# Altium footprint library SoM_Artix.PcbLib: 239 footprints (part 12 of 15)
Each footprint in its own frame and in the unit in brackets; x right, y up, seen from the top. Pads: shape width x height; smd on the part's side, far side on the other; paste and mask are expansions set on the pad; w line width, h text height; cw(c..) or ccw(c..) is an arc to the next point about the centre after c.
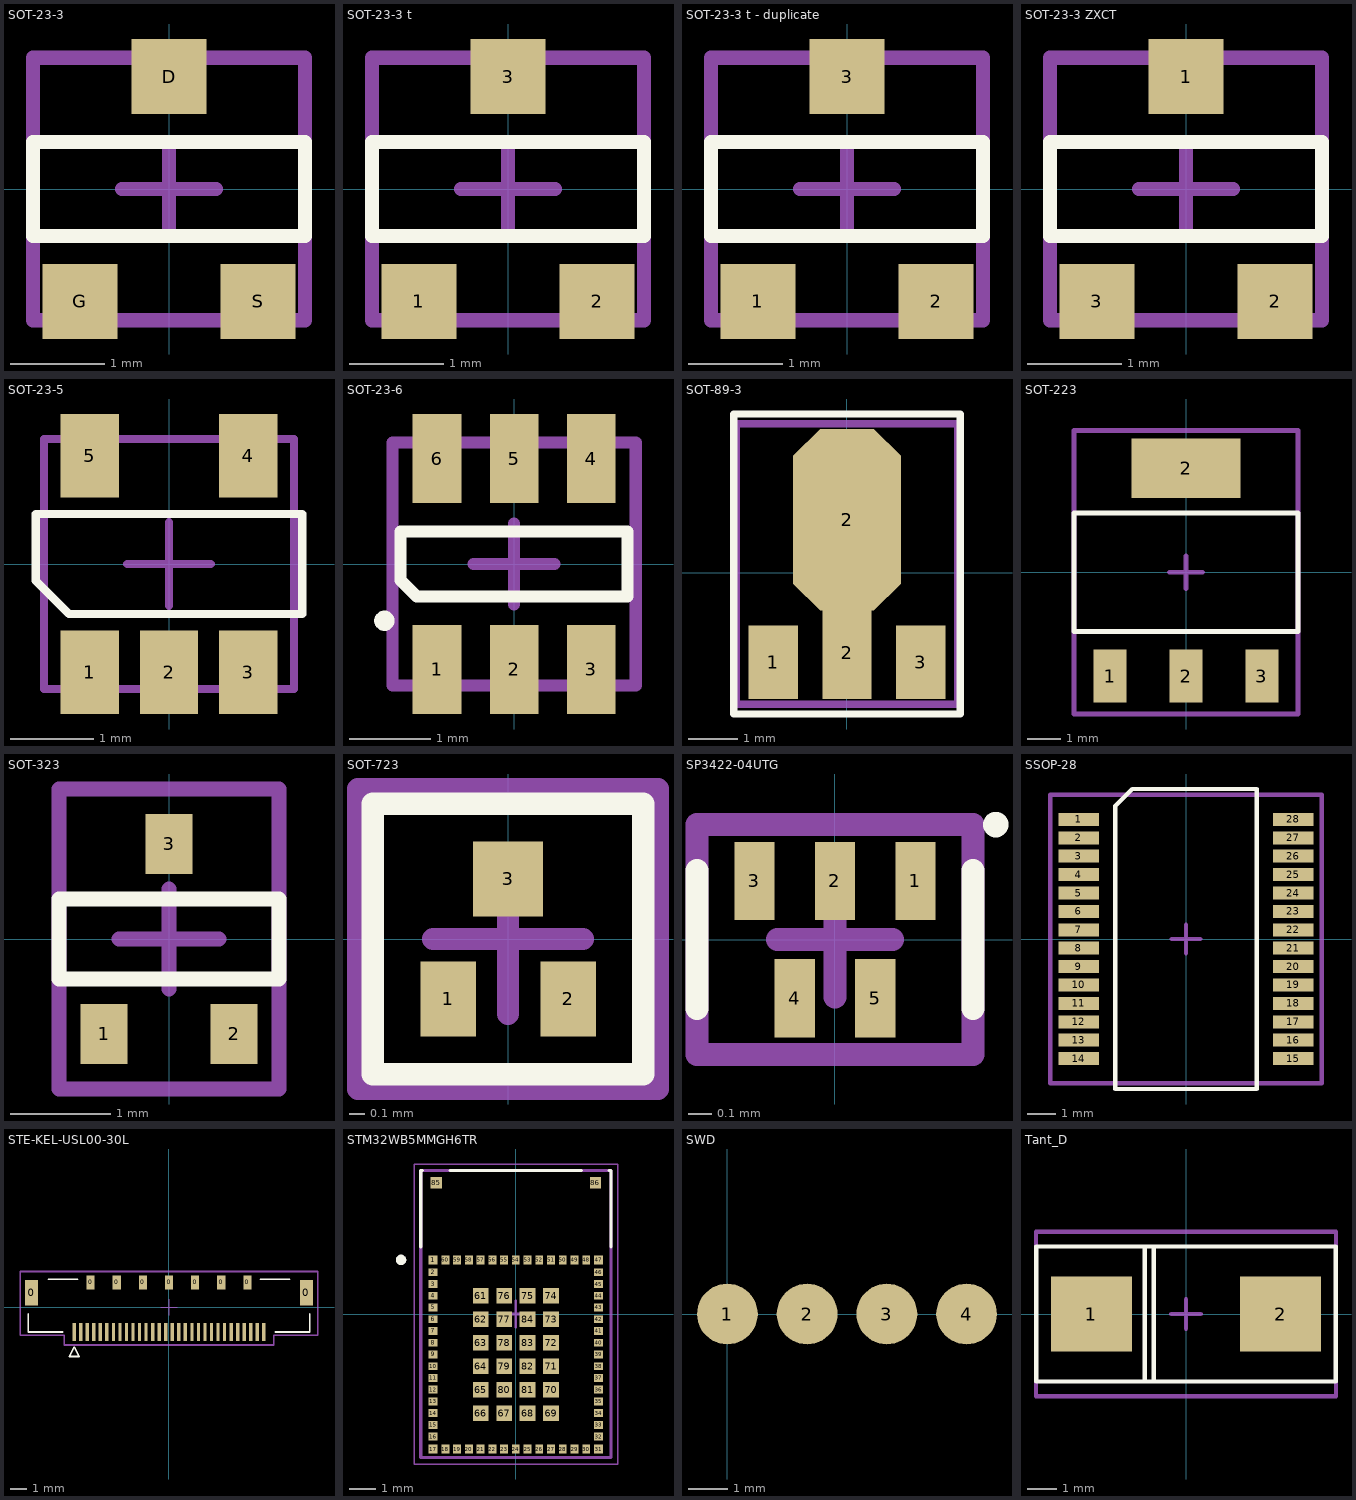
[diagram p11: the footprints below, top view; thin cyan lines are the x and y axes]

## SOT-23-3 [mm]
height 1.25
pads (3):
  rect 0.8x0.8 smd: D(0,1.2) G(-0.95,-1.2) S(0.95,-1.2)
Top Overlay:
  lines w0.15: -1.45,-0.5 -1.45,0.5 1.45,0.5 1.45,-0.5 -1.45,-0.5
Mechanical 13:
  lines w0.15: -0.5,0 0.5,0 ; 0,-0.5 0,0.5 ; -1.45,-1.4 -1.45,1.4 1.45,1.4 1.45,-1.4 -1.45,-1.4
3D body "CircuitWorks-SOT-23.step": height 1.1, standoff 0, extent -1.5,-1.25 1.5,1.25

## SOT-23-3 t [mm]
height 1.25
pads (3):
  rect 0.8x0.8 smd: 1(-0.95,-1.2) 2(0.95,-1.2) 3(0,1.2)
Top Overlay:
  lines w0.15: -1.45,-0.5 -1.45,0.5 1.45,0.5 1.45,-0.5 -1.45,-0.5
Mechanical 13:
  lines w0.15: -0.5,0 0.5,0 ; 0,-0.5 0,0.5 ; -1.45,-1.4 -1.45,1.4 1.45,1.4 1.45,-1.4 -1.45,-1.4
3D body "CircuitWorks-SOT-23.step": height 1.1, standoff 0, extent -1.5,-1.25 1.5,1.25

## SOT-23-3 t - duplicate [mm]
height 1.25
pads (3):
  rect 0.8x0.8 smd: 1(-0.95,-1.2) 2(0.95,-1.2) 3(0,1.2)
Top Overlay:
  lines w0.15: -1.45,-0.5 1.45,-0.5 1.45,0.5 -1.45,0.5 -1.45,-0.5
Mechanical 13:
  lines w0.15: -0.5,0 0.5,0 ; 0,-0.5 0,0.5 ; -1.45,-1.4 1.45,-1.4 1.45,1.4 -1.45,1.4 -1.45,-1.4
3D body "CircuitWorks-SOT-23.step": height 1.1, standoff 0, extent -1.5,-1.25 1.5,1.25

## SOT-23-3 ZXCT [mm]
height 1.25
pads (3):
  rect 0.8x0.8 smd: 1(0,1.2) 2(0.95,-1.2) 3(-0.95,-1.2)
Top Overlay:
  lines w0.15: -1.45,-0.5 1.45,-0.5 1.45,0.5 -1.45,0.5 -1.45,-0.5
Mechanical 13:
  lines w0.15: -0.5,0 0.5,0 ; 0,-0.5 0,0.5 ; -1.45,-1.4 1.45,-1.4 1.45,1.4 -1.45,1.4 -1.45,-1.4
3D body "CircuitWorks-SOT-23.step": height 1.1, standoff 0, extent -1.5,-1.25 1.5,1.25

## SOT-23-5 [mm] "SOT-23-5"
height 1.25
pads (5):
  rect 0.7x1 smd: 1(-0.95,-1.3) 2(0,-1.3) 3(0.95,-1.3) 4(0.95,1.3) 5(-0.95,1.3)
Top Overlay:
  lines w0.1: -1.6,-0.2 -1.2,-0.6 1.6,-0.6 1.6,0.6 -1.6,0.6 -1.6,-0.2
Mechanical 15:
  lines w0.1: -0.5,0 0.5,0 ; 0,-0.5 0,0.5 ; -1.5,-1.5 -1.5,1.5 1.5,1.5 1.5,-1.5 -1.5,-1.5
3D body "User Library-SOT23-5-2.step": height 1.45, standoff 0, extent -1.45,-1.4 1.45,1.4

## SOT-23-6 [mm]
pads (6):
  rect 0.6x1.1 smd: 1(-0.95,-1.3) 2(0,-1.3) 3(0.95,-1.3) 4(0.95,1.3) 5(0,1.3) 6(-0.95,1.3)
Top Overlay:
  circle w0.15: c-1.6,-0.7 r0.05
  lines w0.15: -1.4,-0.2 -1.2,-0.4 1.4,-0.4 1.4,0.4 -1.4,0.4 -1.4,-0.2
Mechanical 13:
  lines w0.15: -0.5,0 0.5,0 ; 0,-0.5 0,0.5 ; -1.5,-1.5 1.5,-1.5 1.5,1.5 -1.5,1.5 -1.5,-1.5
3D body "User Library-SOT23-6-2.step": height 1.45, standoff 0, extent -1.45,-1.4 1.45,1.4

## SOT-89-3 [mm]
height 1.5
pads (4):
  rect 1x1.5 smd: 1(-1.5,-1.825) 3(1.5,-1.825)
  rect 1x1.9 smd: 2(0,-1.625)
  oct 2.2x3.7 smd paste-0.2: 2(0,1.075)
Top Overlay:
  lines w0.15: -2.3,-2.875 -2.3,3.225 2.3,3.225 2.3,-2.875 -2.3,-2.875
Mechanical 13:
  lines w0.15: -0.5,-0.375 0.5,-0.375 ; 0,-0.875 0,0.125 ; -2.25,-2.675 2.25,-2.675 2.25,3.025 -2.25,3.025 -2.25,-2.675
3D body "User Library-SOT89-3.STEP": height 1.54, standoff 0, extent -2.25,-2.125 2.25,2.125

## SOT-223 [mm]
pads (4):
  rect 1x1.6 smd: 1(-2.3,-3.15) 2(0,-3.15) 3(2.3,-3.15)
  rect 3.3x1.8 smd: 2(0,3.15)
Top Overlay:
  lines w0.15: -3.4,-1.8 -3.4,1.8 3.4,1.8 3.4,-1.8 -3.4,-1.8
Mechanical 15:
  lines w0.15: -0.5,0 0.5,0 ; 0,-0.5 0,0.5 ; -3.4,-4.3 3.4,-4.3 3.4,4.3 -3.4,4.3 -3.4,-4.3
3D body "CircuitWorks-SOT-223.step": height 1.68, standoff 0, extent -3.25,-3.48 3.25,3.48

## SOT-323 [mm]
pads (3):
  rect 0.47x0.6 smd: 1(-0.65,-0.95) 2(0.65,-0.95) 3(0,0.95)
Top Overlay:
  lines w0.15: -1.1,-0.4 1.1,-0.4 1.1,0.4 -1.1,0.4 -1.1,-0.4
Mechanical 13:
  lines w0.15: -0.5,0 0.5,0 ; 0,-0.5 0,0.5 ; -1.1,-1.5 1.1,-1.5 1.1,1.5 -1.1,1.5 -1.1,-1.5
3D body "User Library-sc70-3.step": height 1, standoff 0, extent -1.05,-1.15 1.05,1.15

## SOT-723 [mm]
pads (3):
  rect 0.37x0.5 smd: 1(-0.4,-0.4) 2(0.4,-0.4)
  rect 0.47x0.5 smd: 3(0,0.4)
Top Overlay:
  lines w0.15: -0.9,-0.9 -0.9,0.9 0.9,0.9 0.9,-0.9 -0.9,-0.9
Mechanical 15:
  lines w0.15: -0.5,0 0.5,0 ; 0,-0.5 0,0.5 ; -1,-1 1,-1 1,1 -1,1 -1,-1
3D body "User Library-SOT-723-3.step": height 0.45, standoff 0, extent -0.625,-0.6 0.625,0.6

## SP3422-04UTG [mm]
pads (5):
  rect 0.175x0.34 smd mask+0.05: 1(0.35,0.255) 2(0,0.255) 3(-0.35,0.255) 4(-0.175,-0.255) 5(0.175,-0.255)
Top Overlay:
  circle w0.1: c0.7,0.5 r0.005
  lines w0.1: -0.6,-0.3 -0.6,0.3 ; 0.6,-0.3 0.6,0.3
Mechanical 15:
  lines w0.1: -0.25,0 0.25,0 ; 0,-0.25 0,0.25 ; -0.6,-0.5 -0.6,0.5 0.6,0.5 0.6,-0.5 -0.6,-0.5
3D body "DFN_04UTG_LTF.step": height 0.51, standoff 0, extent -0.546,-0.356 0.546,0.356

## SSOP-28 [mm]
pads (28):
  rect 1.43x0.46 smd: 1(-3.795,4.225) 2(-3.795,3.575) 3(-3.795,2.925) 4(-3.795,2.275) 5(-3.795,1.625) 6(-3.795,0.975) 7(-3.795,0.325) 8(-3.795,-0.325) 9(-3.795,-0.975) 10(-3.795,-1.625) 11(-3.795,-2.275) 12(-3.795,-2.925) 13(-3.795,-3.575) 14(-3.795,-4.225) 15(3.795,-4.225) 16(3.795,-3.575) 17(3.795,-2.925) 18(3.795,-2.275) 19(3.795,-1.625) 20(3.795,-0.975) 21(3.795,-0.325) 22(3.795,0.325) 23(3.795,0.975) 24(3.795,1.625) 25(3.795,2.275) 26(3.795,2.925) 27(3.795,3.575) 28(3.795,4.225)
Top Overlay:
  lines w0.15: -2.5,-5.3 2.5,-5.3 2.5,5.3 -1.9,5.3 -2.5,4.7 -2.5,-5.3
Mechanical 13:
  lines w0.15: -0.5,0 0.5,0 ; 0,-0.5 0,0.5 ; -4.8,-5.1 4.8,-5.1 4.8,5.1 -4.8,5.1 -4.8,-5.1
3D body "User Library-ssop28_model.STEP": height 2.01, standoff 0.01, extent -3.909,-5.098 3.891,5.102

## STE-KEL-USL00-30L [mm]
height 1
pads (39):
  rect 0.8x1.55 smd: 0(-8.4,0.885) 0(8.4,0.885)
  rect 0.5x0.88 smd: 0(-4.8,1.515) 0(-3.2,1.515) 0(-1.6,1.515) 0(0,1.515) 0(1.6,1.515) 0(3.2,1.515) 0(4.8,1.515)
  rect 0.2x1.1 smd: 1(-5.8,-1.515) 2(-5.4,-1.515) 3(-5,-1.515) 4(-4.6,-1.515) 5(-4.2,-1.515) 6(-3.8,-1.515) 7(-3.4,-1.515) 8(-3,-1.515) 9(-2.6,-1.515) 10(-2.2,-1.515) 11(-1.8,-1.515) 12(-1.4,-1.515) 13(-1,-1.515) 14(-0.6,-1.515) 15(-0.2,-1.515) 16(0.2,-1.515) 17(0.6,-1.515) 18(1,-1.515) 19(1.4,-1.515) 20(1.8,-1.515) 21(2.2,-1.515) 22(2.6,-1.515) 23(3,-1.515) 24(3.4,-1.515) 25(3.8,-1.515) 26(4.2,-1.515) 27(4.6,-1.515) 28(5,-1.515) 29(5.4,-1.515) 30(5.8,-1.515)
Top Overlay:
  lines w0.1: -8.6,-0.415 -8.6,-1.515 -6.5,-1.515 ; -7.375,1.71 -5.6,1.71 ; 5.6,1.71 7.375,1.71 ; 6.5,-1.515 8.6,-1.515 8.6,-0.415 ; -6.1,-3.015 -5.8,-2.44 -5.5,-3.015 -6.1,-3.015
Mechanical 13:
  lines w0.05: -0.5,0 0,0 ; 0,-0.5 0,0 ; 0,0.5 0,0 ; 0.5,0 0,0
  lines w0.1: -9.1,-1.715 -9.1,2.185 9.1,2.185 9.1,-1.715 6.4,-1.715 6.4,-2.315 -6.4,-2.315 -6.4,-1.715 -9.1,-1.715
3D body "User Library-usl00-30l_p0-4_l16-6_w2-75-1.step": height 0.97, standoff -0.03, extent -8.3,-1.515 8.3,1.585

## STM32WB5MMGH6TR [mm]
pads (86):
  rect 0.35x0.35 smd mask+0.05: 1(-3.175,2.075) 17(-3.175,-5.175) 31(3.175,-5.175) 47(3.175,2.075)
  rect 0.35x0.3 smd mask+0.05: 2(-3.175,1.6) 3(-3.175,1.15) 4(-3.175,0.7) 5(-3.175,0.25) 6(-3.175,-0.2) 7(-3.175,-0.65) 8(-3.175,-1.1) 9(-3.175,-1.55) 10(-3.175,-2) 11(-3.175,-2.45) 12(-3.175,-2.9) 13(-3.175,-3.35) 14(-3.175,-3.8) 15(-3.175,-4.25) 16(-3.175,-4.7) 32(3.175,-4.7) 33(3.175,-4.25) 34(3.175,-3.8) 35(3.175,-3.35) 36(3.175,-2.9) 37(3.175,-2.45) 38(3.175,-2) 39(3.175,-1.55) 40(3.175,-1.1) 41(3.175,-0.65) 42(3.175,-0.2) 43(3.175,0.25) 44(3.175,0.7) 45(3.175,1.15) 46(3.175,1.6)
  rect 0.3x0.35 smd mask+0.05: 18(-2.7,-5.175) 19(-2.25,-5.175) 20(-1.8,-5.175) 21(-1.35,-5.175) 22(-0.9,-5.175) 23(-0.45,-5.175) 24(0,-5.175) 25(0.45,-5.175) 26(0.9,-5.175) 27(1.35,-5.175) 28(1.8,-5.175) 29(2.25,-5.175) 30(2.7,-5.175) 48(2.7,2.075) 49(2.25,2.075) 50(1.8,2.075) 51(1.35,2.075) 52(0.9,2.075) 53(0.45,2.075) 54(0,2.075) 55(-0.45,2.075) 56(-0.9,2.075) 57(-1.35,2.075) 58(-1.8,2.075) 59(-2.25,2.075) 60(-2.7,2.075)
  rect 0.6x0.6 smd mask+0.05: 61(-1.35,0.7) 62(-1.35,-0.2) 63(-1.35,-1.1) 64(-1.35,-2) 65(-1.35,-2.9) 66(-1.35,-3.8) 67(-0.45,-3.8) 68(0.45,-3.8) 69(1.35,-3.8) 70(1.35,-2.9) 71(1.35,-2) 72(1.35,-1.1) 73(1.35,-0.2) 74(1.35,0.7) 75(0.45,0.7) 76(-0.45,0.7) 77(-0.45,-0.2) 78(-0.45,-1.1) 79(-0.45,-2) 80(-0.45,-2.9) 81(0.45,-2.9) 82(0.45,-2) 83(0.45,-1.1) 84(0.45,-0.2)
  rect 0.43x0.43 smd mask+0.05: 85(-3.05,5.035) 86(3.05,5.035)
Top Overlay:
  circle w0.2: c-4.4,2.075 r0.1
  circle w0.2: c-4.4,2.075 r0.1
  lines w0.127: -3.65,2.57 -3.65,5.5 -3.585,5.5 ; -2.515,5.5 2.515,5.5 ; 3.585,5.5 3.65,5.5 3.65,2.57
Mechanical 15:
  lines w0.05: -3.9,-5.75 -3.9,5.75 3.9,5.75 3.9,-5.75 -3.9,-5.75
  lines w0.1: -0.5,0 0.5,0 ; 0,-0.5 0,0.5
  lines w0.127: -3.65,-5.5 -3.65,5.5 3.65,5.5 3.65,-5.5 -3.65,-5.5
3D body "step_temp.STEP": height 1.43, standoff -0.01, extent -3.65,-5.5 3.65,5.5

## SWD [mil]
pads (4):
  round 60 smd paste-60 mask+2.01: 1(0,0) 2(78.74,0) 3(157.48,0) 4(236.22,0)

## Tant_D [mm]
pads (2):
  rect 2.77x2.55 smd: 1(-3.22,0) 2(3.22,0)
Top Overlay:
  lines w0.15: -1.5,2.3 -5.1,2.3 ; -1.4,-2.3 -1.4,2.3 ; -1.1,-2.3 -1.1,2.3 ; -5.1,2.3 -5.1,-2.3 5.1,-2.3 5.1,2.3 -5.1,2.3
Mechanical 13:
  lines w0.15: -0.5,0 0.5,0 ; 0,-0.5 0,0.5 ; -5.11,-2.8 -5.11,2.8 5.11,2.8 5.11,-2.8 -5.11,-2.8
3D body "t494d476k016at.stp": height 3.11, standoff 0.01, extent -3.8,-2.3 3.8,2.3